# Altium footprint library SoM_Artix.PcbLib: 239 footprints (part 8 of 15)
Each footprint in its own frame and in the unit in brackets; x right, y up, seen from the top. Pads: shape width x height; smd on the part's side, far side on the other; paste and mask are expansions set on the pad; w line width, h text height; cw(c..) or ccw(c..) is an arc to the next point about the centre after c.
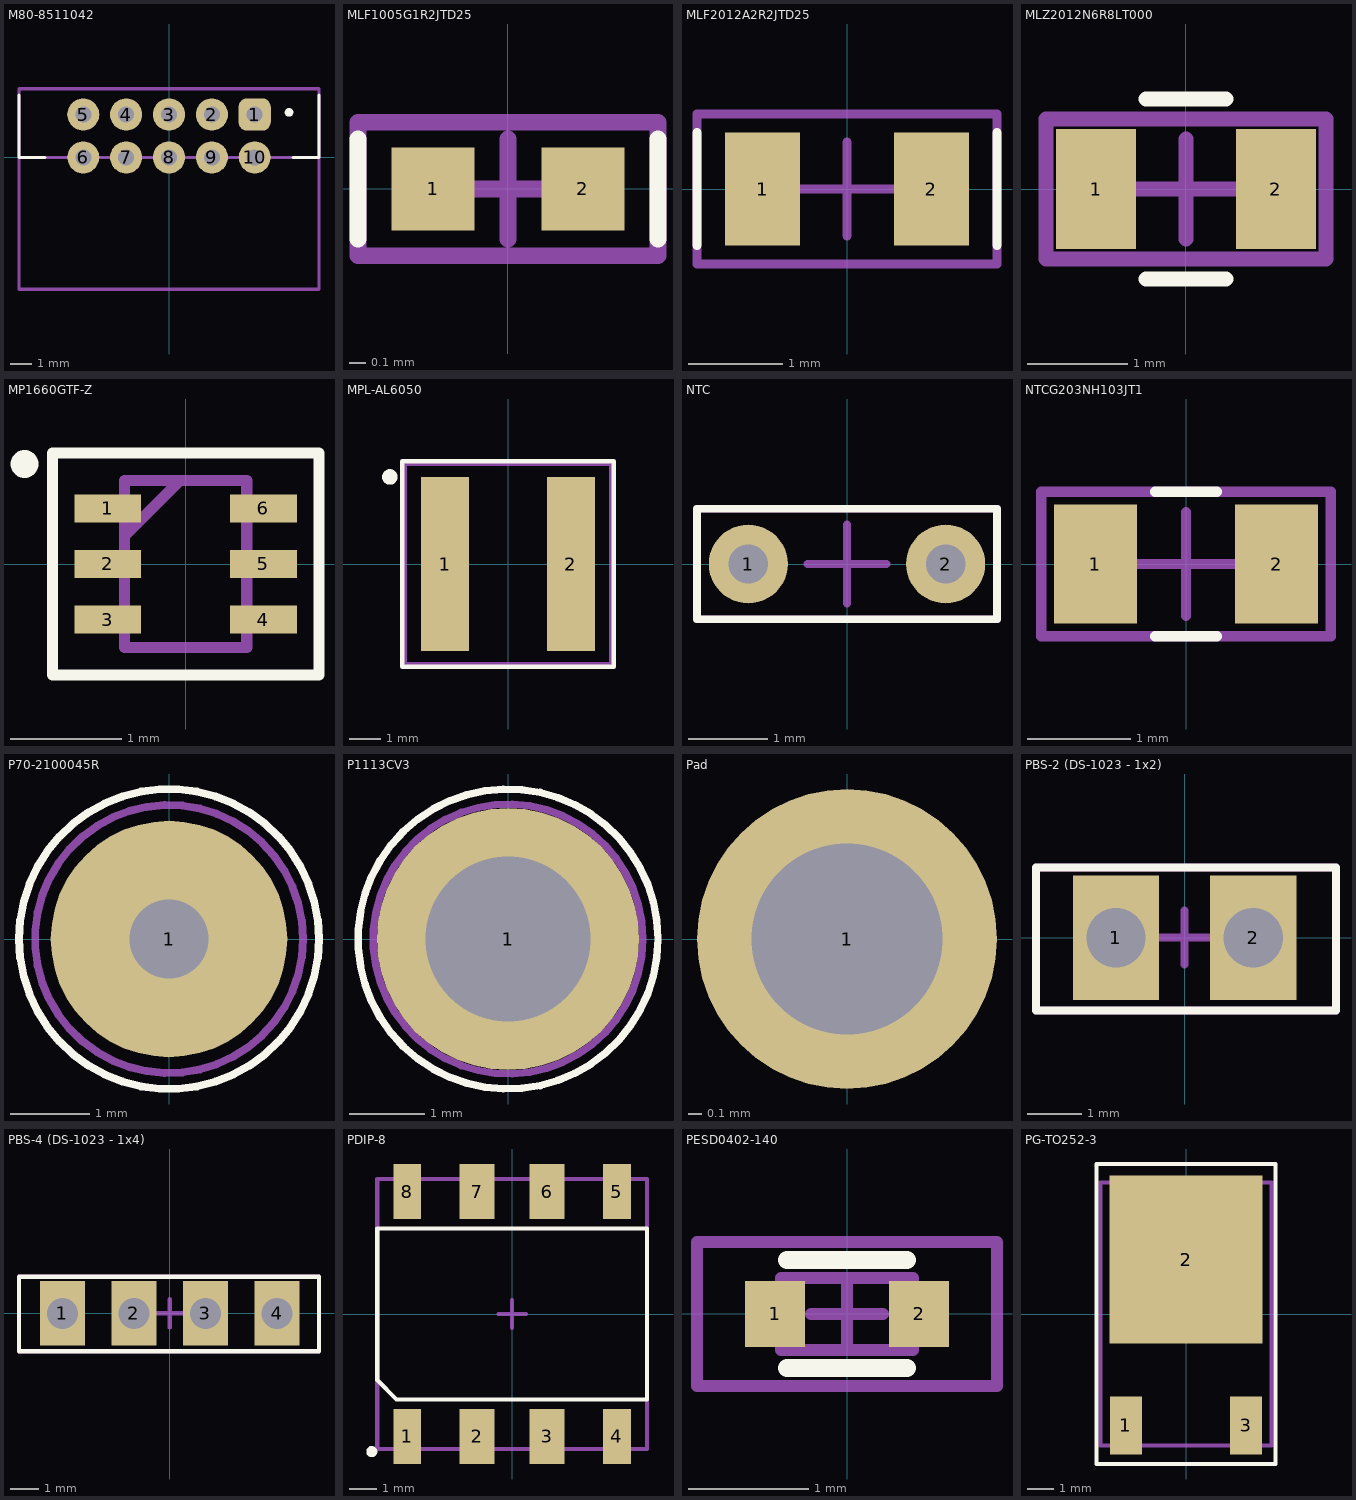
[diagram p7: the footprints below, top view; thin cyan lines are the x and y axes]

## M80-8511042 [mm]
pads (10):
  rrect50% 1.5x1.5 hole 0.75: 1(4,2)
  round 1.5 hole 0.75: 2(2,2) 3(0,2) 4(-2,2) 5(-4,2) 6(-4,0) 7(-2,0) 8(0,0) 9(2,0) 10(4,0)
Top Overlay:
  circle w0.2: c5.6,2.1 r0.1
  lines w0.15: -7,2.9 -7,0 -5.8,0 ; 5.8,0 7,0 7,2.9
Mechanical 13:
  lines w0.15: -7,0 -7,3.2 7,3.2 7,0 ; -7,0 7,0 ; -7,0 -7,-6.15 7,-6.15 7,0

## MLF1005G1R2JTD25 [mm]
pads (2):
  rect 0.5x0.5 smd mask+0.05: 1(-0.45,0) 2(0.45,0)
Top Overlay:
  lines w0.1: -0.9,-0.3 -0.9,0.3 ; 0.9,-0.3 0.9,0.3
Mechanical 15:
  lines w0.1: -0.3,0 0.3,0 ; 0,-0.3 0,0.3 ; -0.9,-0.4 0.9,-0.4 0.9,0.4 -0.9,0.4 -0.9,-0.4
3D body "User Library-d0402h025.step": height 0.25, standoff 0, extent -0.5,-0.25 0.5,0.25

## MLF2012A2R2JTD25 [mm]
pads (2):
  rect 0.8x1.2 smd: 1(-0.9,0) 2(0.9,0)
Top Overlay:
  lines w0.1: -1.6,-0.6 -1.6,0.6 ; 1.6,-0.6 1.6,0.6
Mechanical 15:
  lines w0.1: -0.5,0 0.5,0 ; 0,-0.5 0,0.5 ; -1.6,-0.8 -1.6,0.8 1.6,0.8 1.6,-0.8 -1.6,-0.8
3D body "74479032.stp": height 1.25, standoff 0, extent -1,-0.625 1,0.625

## MLZ2012N6R8LT000 [mm]
pads (2):
  rect 0.8x1.2 smd mask+0.08: 1(-0.9,0) 2(0.9,0)
Top Overlay:
  lines w0.15: -0.4,-0.9 0.4,-0.9 ; -0.4,0.9 0.4,0.9
Mechanical 15:
  lines w0.15: -0.5,0 0.5,0 ; 0,-0.5 0,0.5 ; -1.4,-0.7 1.4,-0.7 1.4,0.7 -1.4,0.7 -1.4,-0.7
3D body "74479032.stp": height 1.25, standoff 0, extent -1,-0.625 1,0.625

## MP1660GTF-Z [mm]
pads (6):
  rect 0.6x0.25 smd: 1(-0.7,0.5) 2(-0.7,0) 3(-0.7,-0.5) 4(0.7,-0.5) 5(0.7,0) 6(0.7,0.5)
Top Overlay:
  circle w0.15: c-1.45,0.9 r0.05
  lines w0.1: -1.2,-1 1.2,-1 1.2,1 -1.2,1 -1.2,-1
Mechanical 15:
  lines w0.1: -0.55,0.25 -0.05,0.75 ; -0.55,-0.75 0.55,-0.75 0.55,0.75 -0.55,0.75 -0.55,-0.75
3D body "User Library-SOT-563_TI.STEP": height 0.59, standoff 0, extent -0.813,-0.8 0.813,0.8

## MPL-AL6050 [mm] "Low-Profile Molded Inductor"
height 4.8
pads (2):
  rect 1.55x5.6 smd: 1(-2.025,0) 2(2.025,0)
Top Overlay:
  circle w0.3: c-3.8,2.8 r0.1
  lines w0.15: -3.4,-3.3 -3.4,3.3 3.4,3.3 3.4,-3.3 -3.4,-3.3
Mechanical 13:
  lines w0.1: -3.3,-3.2 -3.3,3.2 3.3,3.2 3.3,-3.2 -3.3,-3.2
3D body "MPL-AL6050-4R7.STEP": height 4.8, standoff 0, extent -3.2,-3.3 3.2,3.3

## NTC [mm]
pads (2):
  round 1 hole 0.5 unplated mask+0.05: 1(-1.25,0) 2(1.25,0)
Top Overlay:
  lines w0.1: -1.9,-0.7 1.9,-0.7 1.9,0.7 -1.9,0.7 -1.9,-0.7
Mechanical 15:
  lines w0.1: -0.5,0 0.5,0 ; 0,-0.5 0,0.5 ; -1.9,-0.7 1.9,-0.7 1.9,0.7 -1.9,0.7 -1.9,-0.7

## NTCG203NH103JT1 [mm]
pads (2):
  rect 0.8x1.15 smd mask+0.05: 1(-0.875,0) 2(0.875,0)
Top Overlay:
  lines w0.1: -0.3,-0.7 0.3,-0.7 ; -0.3,0.7 0.3,0.7
Mechanical 15:
  lines w0.1: -0.5,0 0.5,0 ; 0,-0.5 0,0.5 ; -1.4,-0.7 -1.4,0.7 1.4,0.7 1.4,-0.7 -1.4,-0.7
3D body "1793950P.stp": height 0.8, standoff 0, extent -1,-0.625 1,0.625

## P70-2100045R [mm]
pads (1):
  round 3 hole 1: 1(0,0)
Top Overlay:
  circle w0.1: c0,0 r1.903
Mechanical 13:
  circle w0.1: c0,0 r1.7
  lines w0.1: -0.5,0 0.5,0 ; 0,-0.5 0,0.5
3D body "p70-2100045.stp": height 5.5, standoff -2, extent -1,-0.993 1,0.993

## P1113CV3 [mm]
pads (1):
  round 3.5 hole 2.2: 1(0,0)
Top Overlay:
  circle w0.1: c0,0 r2.003
Mechanical 13:
  circle w0.1: c0,0 r1.8
  lines w0.1: -0.5,0 0.5,0 ; 0,-0.5 0,0.5
3D body "p1113cv3.stp": height 7.2, standoff -20.01, extent -1.275,-1.275 1.275,1.275

## Pad [mm]
pads (1):
  round 2.2 hole 1.4: 1(0,0)

## PBS-2 (DS-1023 - 1x2) [mm] "2 point header"
pads (2):
  rect 1.6x2.3 hole 1.1: 1(-1.27,0) 2(1.27,0)
Top Overlay:
  lines w0.15: -2.75,-1.35 2.8,-1.35 2.8,1.3 -2.75,1.3 -2.75,-1.35
Mechanical 13:
  lines w0.15: -0.5,0 0.5,0 ; 0,-0.5 0,0.5 ; -2.75,-1.35 -2.75,1.3 2.8,1.3 2.8,-1.35 -2.75,-1.35
3D body "User Library-PBS_(DS1023)_1line_connectors_h=5_0_8_5mm_step_2_54mm-1 (1).step": height 8.5, standoff -3, extent -2.79,-1.25 2.79,1.25

## PBS-4 (DS-1023 - 1x4) [mm] "4 point header"
pads (4):
  rect 1.6x2.3 hole 1.1: 1(-3.81,0) 2(-1.27,0) 3(1.27,0) 4(3.81,0)
Top Overlay:
  lines w0.15: -5.35,-1.35 5.3,-1.35 5.3,1.3 -5.35,1.3 -5.35,-1.35
Mechanical 13:
  lines w0.15: -0.5,0 0.5,0 ; 0,-0.5 0,0.5 ; -5.35,-1.35 -5.35,1.3 5.3,1.3 5.3,-1.35 -5.35,-1.35
3D body "User Library-PBS_(DS1023)_1line_connectors_h=5_0_8_5mm_step_2_54mm-1.step": height 8.5, standoff -3, extent -5.33,-1.25 5.33,1.25

## PDIP-8 [mm]
height 3.6
pads (8):
  rect 1x2 smd: 1(-3.81,-4.45) 4(3.81,-4.45) 5(3.81,4.45) 8(-3.81,4.45)
  rect 1.27x2 smd: 2(-1.27,-4.45) 3(1.27,-4.45) 6(1.27,4.45) 7(-1.27,4.45)
Top Overlay:
  circle w0.2: c-5.1,-5 r0.1
  lines w0.15: -4.9,-2.4 -4.2,-3.1 4.9,-3.1 4.9,3.1 -4.9,3.1 -4.9,-2.4
Mechanical 13:
  lines w0.15: -0.5,0 0.5,0 ; 0,-0.5 0,0.5 ; -4.9,-4.9 -4.9,4.9 4.9,4.9 4.9,-4.9 -4.9,-4.9
3D body "User Library-PDIP8_GW.step": height 4.32, standoff 0, extent -4.828,-5.15 4.828,5.15

## PESD0402-140 [mm]
pads (2):
  rect 0.5x0.55 smd: 1(-0.6,0) 2(0.6,0)
Top Overlay:
  lines w0.15: -0.5,-0.45 0.5,-0.45 ; -0.5,0.45 0.5,0.45
Mechanical 13:
  lines w0.1: -0.55,-0.3 0.55,-0.3 0.55,0.3 -0.55,0.3 -0.55,-0.3
Mechanical 15:
  lines w0.1: -0.3,0 0.3,0 ; 0,-0.3 0,0.3 ; -1.25,-0.6 1.25,-0.6 1.25,0.6 -1.25,0.6 -1.25,-0.6
3D body "User Library-Fast Acting Surface-Mount Fuses.step": height 0.51, standoff 0, extent -0.5,-0.256 0.5,0.256

## PG-TO252-3 [mm]
pads (3):
  rect 1.2x2.2 smd: 1(-2.28,-4.23) 3(2.28,-4.23)
  rect 5.8x6.4 smd: 2(0,2.07)
Top Overlay:
  lines w0.15: -3.4,-5.7 3.4,-5.7 3.4,5.7 -3.4,5.7 -3.4,-5.7
Mechanical 13:
  lines w0.15: -1,0 1,0 ; 0,-1 0,1 ; -3.25,-5 3.25,-5 3.25,5 -3.25,5 -3.25,-5
3D body "CircuitWorks-TO-252.step": height 2.3, standoff 0, extent -3.29,-4.873 3.29,4.827